# Altium footprint library TranDangKhoa-LIB.PcbLib: 1435 footprints (part 89 of 90)
Each footprint in its own frame and in the unit in brackets; x right, y up, seen from the top. Pads: shape width x height; smd on the part's side, far side on the other; paste and mask are expansions set on the pad; w line width, h text height; cw(c..) or ccw(c..) is an arc to the next point about the centre after c.
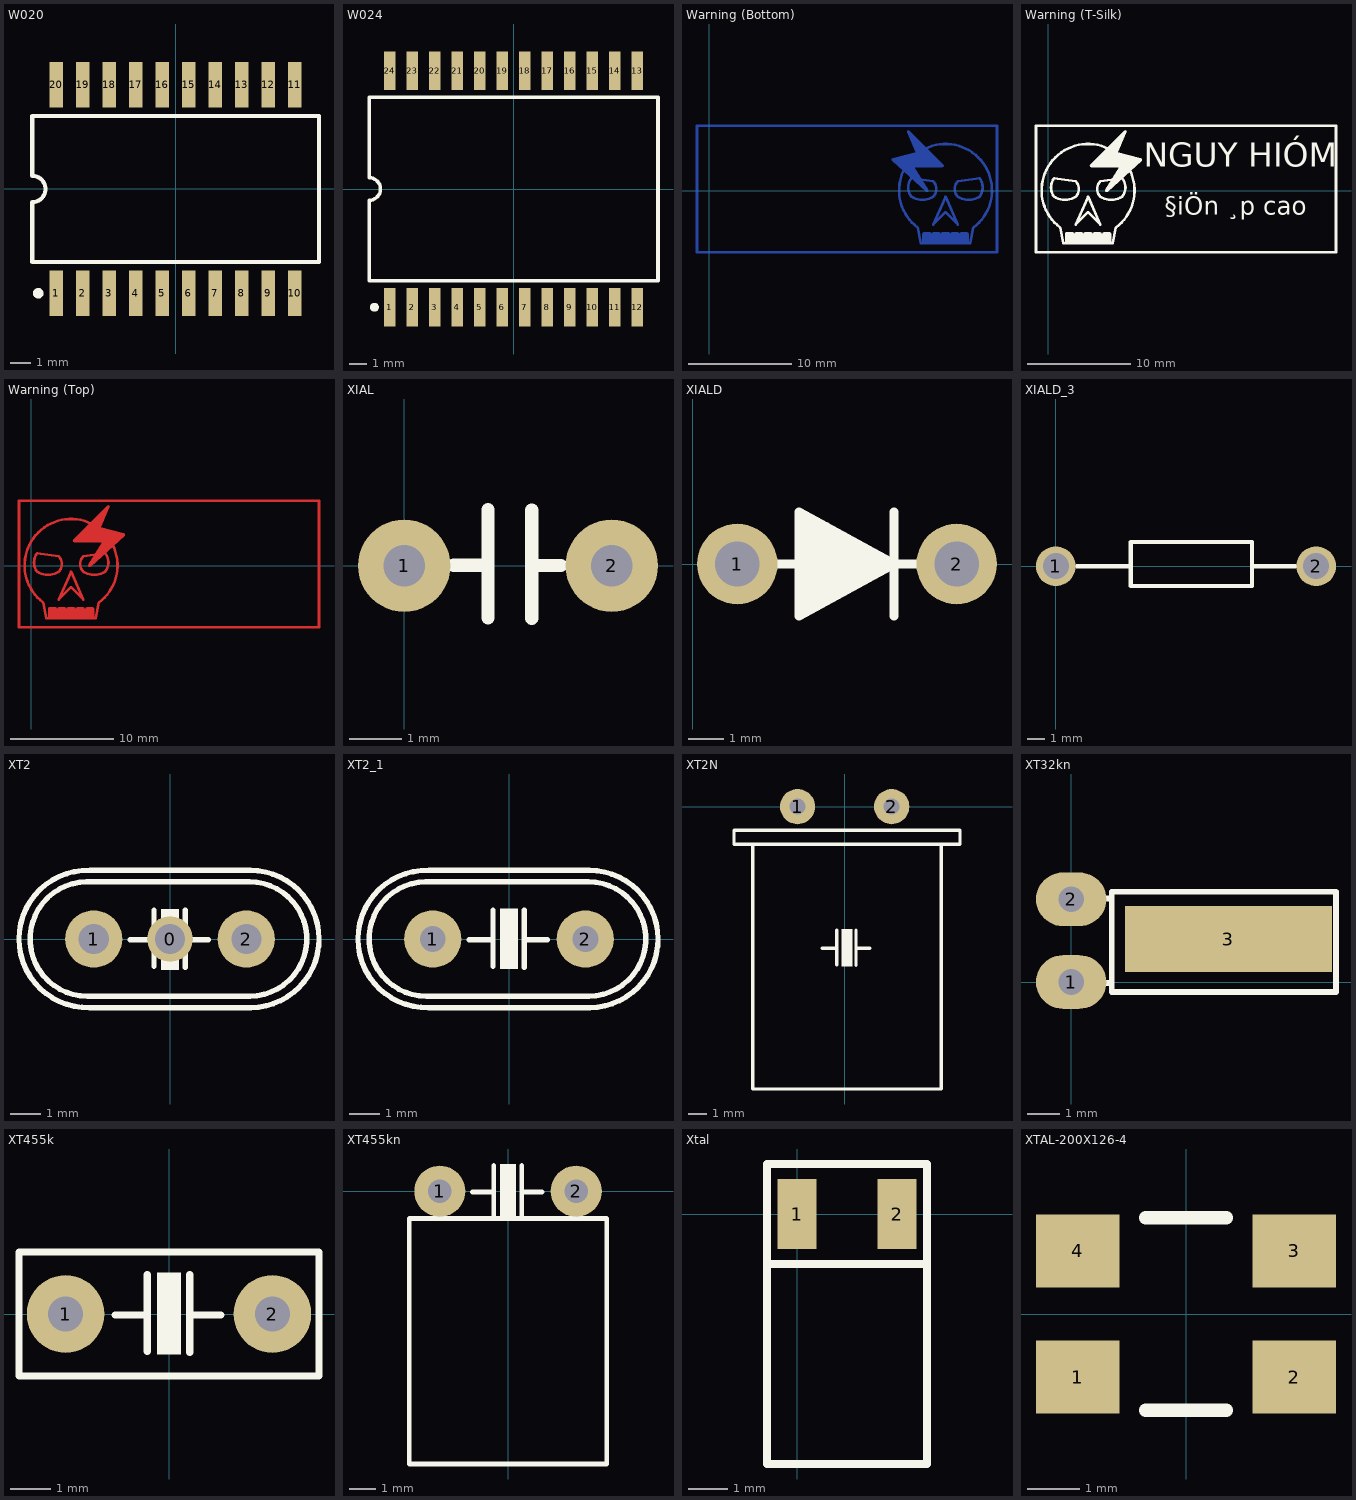
[diagram p88: the footprints below, top view; thin cyan lines are the x and y axes]

## W020 [mm] "DFP; 20 Leads; Body 13.7 x 7.6 mm (LxW max); Pitch 1.27 mm"
height 2.54
pads (20):
  rect 0.65x2.2 smd: 1(-5.715,-5) 2(-4.445,-5) 3(-3.175,-5) 4(-1.905,-5) 5(-0.635,-5) 6(0.635,-5) 7(1.905,-5) 8(3.175,-5) 9(4.445,-5) 10(5.715,-5) 11(5.715,5) 12(4.445,5) 13(3.175,5) 14(1.905,5) 15(0.635,5) 16(-0.635,5) 17(-1.905,5) 18(-3.175,5) 19(-4.445,5) 20(-5.715,5)
Top Overlay:
  circle w0.25: c-6.59,-5 r0.125
  lines w0.2: -6.875,-3.5 6.875,-3.5 6.875,3.5 -6.875,3.5 -6.875,0.635 cw(c-6.875,0) -6.875,-0.635 -6.875,-3.5

## W024 [mm] "DFP; 24 Leads; Body 16.3 x 9.5 mm (LxW max); Pitch 1.27 mm"
height 2.29
pads (24):
  rect 0.65x2.2 smd: 1(-6.985,-6.675) 2(-5.715,-6.675) 3(-4.445,-6.675) 4(-3.175,-6.675) 5(-1.905,-6.675) 6(-0.635,-6.675) 7(0.635,-6.675) 8(1.905,-6.675) 9(3.175,-6.675) 10(4.445,-6.675) 11(5.715,-6.675) 12(6.985,-6.675) 13(6.985,6.675) 14(5.715,6.675) 15(4.445,6.675) 16(3.175,6.675) 17(1.905,6.675) 18(0.635,6.675) 19(-0.635,6.675) 20(-1.905,6.675) 21(-3.175,6.675) 22(-4.445,6.675) 23(-5.715,6.675) 24(-6.985,6.675)
Top Overlay:
  circle w0.25: c-7.86,-6.675 r0.125
  lines w0.2: -8.15,-5.175 -8.15,-0.635 ccw(c-8.15,0) -8.15,0.635 -8.15,5.175 8.15,5.175 8.15,-5.175 -8.15,-5.175

## Warning (Bottom) [mm]
Bottom Layer:
  region: 19.314,5.829 19.285,5.829 19.267,5.81 19.242,5.8 19.232,5.774 19.212,5.754 19.212,5.727 19.202,5.703 19.213,5.677 19.213,5.649 20.05,3.696 17.806,3.135 17.773,3.111 17.737,3.094 17.732,3.081 17.721,3.073 17.715,3.033 17.702,2.995 17.708,2.983 17.705,2.969 17.729,2.936 17.746,2.9 21.048,-0.102 21.081,-0.114 21.11,-0.134 21.129,-0.131 21.147,-0.137 21.179,-0.122 21.213,-0.117 21.225,-0.101 21.242,-0.092 21.254,-0.059 21.274,-0.031 21.271,-0.012 21.278,0.007 21.263,0.038 21.257,0.073 19.888,2.264 22.641,2.264 22.738,2.304 22.779,2.401 22.738,2.498 19.437,5.8 19.411,5.811 19.391,5.83 19.364,5.83 19.34,5.84
  region: 24.345,-4.105 24.305,-4.202 24.305,-5.102 24.345,-5.2 24.442,-5.24 25.042,-5.24 25.139,-5.2 25.18,-5.102 25.18,-4.202 25.139,-4.105 25.042,-4.065 24.442,-4.065
  region: 21.644,-4.105 21.603,-4.202 21.603,-5.102 21.644,-5.2 21.741,-5.24 22.341,-5.24 22.438,-5.2 22.478,-5.102 22.478,-4.202 22.438,-4.105 22.341,-4.065 21.741,-4.065
  region: 20.743,-4.105 20.703,-4.202 20.703,-5.102 20.743,-5.2 20.84,-5.24 21.441,-5.24 21.538,-5.2 21.578,-5.102 21.578,-4.202 21.538,-4.105 21.441,-4.065 20.84,-4.065
  region: 23.444,-4.105 23.404,-4.202 23.404,-5.102 23.444,-5.2 23.542,-5.24 24.142,-5.24 24.239,-5.2 24.279,-5.102 24.279,-4.202 24.239,-4.105 24.142,-4.065 23.542,-4.065
  region: 22.544,-4.105 22.504,-4.202 22.504,-5.102 22.544,-5.2 22.641,-5.24 23.241,-5.24 23.338,-5.2 23.378,-5.102 23.378,-4.202 23.338,-4.105 23.241,-4.065 22.641,-4.065
  lines w0.254: -1.201,-6.003 27.94,-6.003 27.94,6.303 -1.201,6.303 -1.201,-6.003 ; 17.839,3.002 20.24,3.602 19.34,5.703 22.641,2.401 19.64,2.401 21.14,0 17.839,3.002 ; 19.64,-0.6 ccw(c20.69,1.05) 21.741,-0.6 ccw(c20.991,0.15) 21.741,0.9 19.64,1.201 ccw(c20.69,0.3) 19.64,-0.6 ; 20.24,-3.602 cw(c22.941,0.014) 25.643,-3.602 25.342,-5.102 20.54,-5.102 20.24,-3.602 ; 21.741,-3.302 22.941,-0.6 24.142,-3.302 22.941,-2.101 21.741,-3.302 ; 24.142,-0.6 cw(c24.892,0.15) 24.142,0.9 26.243,1.201 cw(c25.042,0.3) 26.243,-0.6 cw(c25.193,1.05) 24.142,-0.6
  text "§iÖn ¸p cao" at 14.732,-3.048 h3
  text "NGUY HIÓM" at 17.526,1.143 h4

## Warning (T-Silk) [mm]
Top Overlay:
  region: 7.483,5.829 7.512,5.829 7.53,5.81 7.555,5.8 7.565,5.774 7.585,5.754 7.585,5.727 7.595,5.703 7.584,5.677 7.584,5.649 6.747,3.696 8.991,3.135 9.024,3.111 9.06,3.094 9.065,3.081 9.076,3.073 9.082,3.033 9.095,2.995 9.089,2.983 9.092,2.969 9.068,2.936 9.051,2.9 5.749,-0.102 5.716,-0.114 5.687,-0.134 5.668,-0.131 5.65,-0.137 5.618,-0.122 5.584,-0.117 5.572,-0.101 5.555,-0.092 5.543,-0.059 5.523,-0.031 5.526,-0.012 5.519,0.007 5.534,0.038 5.54,0.073 6.909,2.264 4.156,2.264 4.059,2.304 4.018,2.401 4.059,2.498 7.36,5.8 7.386,5.811 7.406,5.83 7.433,5.83 7.457,5.84
  region: 2.452,-4.105 2.492,-4.202 2.492,-5.102 2.452,-5.2 2.355,-5.24 1.755,-5.24 1.658,-5.2 1.617,-5.102 1.617,-4.202 1.658,-4.105 1.755,-4.065 2.355,-4.065
  region: 5.153,-4.105 5.194,-4.202 5.194,-5.102 5.153,-5.2 5.056,-5.24 4.456,-5.24 4.359,-5.2 4.319,-5.102 4.319,-4.202 4.359,-4.105 4.456,-4.065 5.056,-4.065
  region: 6.054,-4.105 6.094,-4.202 6.094,-5.102 6.054,-5.2 5.957,-5.24 5.356,-5.24 5.259,-5.2 5.219,-5.102 5.219,-4.202 5.259,-4.105 5.356,-4.065 5.957,-4.065
  region: 3.353,-4.105 3.393,-4.202 3.393,-5.102 3.353,-5.2 3.255,-5.24 2.655,-5.24 2.558,-5.2 2.518,-5.102 2.518,-4.202 2.558,-4.105 2.655,-4.065 3.255,-4.065
  region: 4.253,-4.105 4.293,-4.202 4.293,-5.102 4.253,-5.2 4.156,-5.24 3.556,-5.24 3.459,-5.2 3.419,-5.102 3.419,-4.202 3.459,-4.105 3.556,-4.065 4.156,-4.065
  lines w0.254: -1.201,-6.003 27.94,-6.003 27.94,6.303 -1.201,6.303 -1.201,-6.003 ; 0.554,-0.6 cw(c1.755,0.3) 0.554,1.201 2.655,0.9 cw(c1.905,0.15) 2.655,-0.6 cw(c1.604,1.05) 0.554,-0.6 ; 1.154,-3.602 cw(c3.856,0.014) 6.557,-3.602 6.257,-5.102 1.455,-5.102 1.154,-3.602 ; 2.655,-3.302 3.856,-2.101 5.056,-3.302 3.856,-0.6 2.655,-3.302 ; 4.156,2.401 7.157,2.401 5.657,0 8.958,3.002 6.557,3.602 7.457,5.703 4.156,2.401 ; 5.056,-0.6 ccw(c6.107,1.05) 7.157,-0.6 ccw(c6.107,0.3) 7.157,1.201 5.056,0.9 ccw(c5.806,0.15) 5.056,-0.6
  text "§iÖn ¸p cao" at 11.303,-2.921 h3
  text "NGUY HIÓM" at 9.271,1.524 h4

## Warning (Top) [mm]
Top Layer:
  region: 7.483,5.829 7.512,5.829 7.53,5.81 7.555,5.8 7.565,5.774 7.585,5.754 7.585,5.727 7.595,5.703 7.584,5.677 7.584,5.649 6.747,3.696 8.991,3.135 9.024,3.111 9.06,3.094 9.065,3.081 9.076,3.073 9.082,3.033 9.095,2.995 9.089,2.983 9.092,2.969 9.068,2.936 9.051,2.9 5.749,-0.102 5.716,-0.114 5.687,-0.134 5.668,-0.131 5.65,-0.137 5.618,-0.122 5.584,-0.117 5.572,-0.101 5.555,-0.092 5.543,-0.059 5.523,-0.031 5.526,-0.012 5.519,0.007 5.534,0.038 5.54,0.073 6.909,2.264 4.156,2.264 4.059,2.304 4.018,2.401 4.059,2.498 7.36,5.8 7.386,5.811 7.406,5.83 7.433,5.83 7.457,5.84
  region: 2.452,-4.105 2.492,-4.202 2.492,-5.102 2.452,-5.2 2.355,-5.24 1.755,-5.24 1.658,-5.2 1.617,-5.102 1.617,-4.202 1.658,-4.105 1.755,-4.065 2.355,-4.065
  region: 5.153,-4.105 5.194,-4.202 5.194,-5.102 5.153,-5.2 5.056,-5.24 4.456,-5.24 4.359,-5.2 4.319,-5.102 4.319,-4.202 4.359,-4.105 4.456,-4.065 5.056,-4.065
  region: 6.054,-4.105 6.094,-4.202 6.094,-5.102 6.054,-5.2 5.957,-5.24 5.356,-5.24 5.259,-5.2 5.219,-5.102 5.219,-4.202 5.259,-4.105 5.356,-4.065 5.957,-4.065
  region: 3.353,-4.105 3.393,-4.202 3.393,-5.102 3.353,-5.2 3.255,-5.24 2.655,-5.24 2.558,-5.2 2.518,-5.102 2.518,-4.202 2.558,-4.105 2.655,-4.065 3.255,-4.065
  region: 4.253,-4.105 4.293,-4.202 4.293,-5.102 4.253,-5.2 4.156,-5.24 3.556,-5.24 3.459,-5.2 3.419,-5.102 3.419,-4.202 3.459,-4.105 3.556,-4.065 4.156,-4.065
  lines w0.254: -1.201,-6.003 27.94,-6.003 27.94,6.303 -1.201,6.303 -1.201,-6.003 ; 0.554,-0.6 cw(c1.755,0.3) 0.554,1.201 2.655,0.9 cw(c1.905,0.15) 2.655,-0.6 cw(c1.604,1.05) 0.554,-0.6 ; 1.154,-3.602 cw(c3.856,0.014) 6.557,-3.602 6.257,-5.102 1.455,-5.102 1.154,-3.602 ; 2.655,-3.302 3.856,-2.101 5.056,-3.302 3.856,-0.6 2.655,-3.302 ; 4.156,2.401 7.157,2.401 5.657,0 8.958,3.002 6.557,3.602 7.457,5.703 4.156,2.401 ; 5.056,-0.6 ccw(c6.107,1.05) 7.157,-0.6 ccw(c6.107,0.3) 7.157,1.201 5.056,0.9 ccw(c5.806,0.15) 5.056,-0.6
  text "§iÖn ¸p cao" at 11.303,-2.921 h3
  text "NGUY HIÓM" at 9.271,1.524 h4

## XIAL [mil]
pads (2):
  round 70 hole 31.5 unplated: 1(0,0) 2(157.48,0)
Top Overlay:
  lines w10: 37.4,0.4 53.6,0.4 63.6,0.4 ; 63.6,-39.6 63.6,0.4 ; 63.6,42.4 63.6,0.4 ; 96.8,-39.8 96.8,42.2 ; 96.8,0.2 104.8,0.2 119,0.2

## XIALD [mil]
pads (2):
  round 90 hole 50 unplated: 1(50,0) 2(295,0)
Top Overlay:
  lines w10: 65,0 119,0 ; 127,-48 127,50 ; 127,46 135,46 135,-42 143,-42 143,42 149,42 149,-32 157,-32 157,34 163,34 163,-28 171,-28 171,24 179,24 179,-20 185,-20 185,18 191,18 191,-14 197,-14 197,12 201,12 201,-8 207,-8 ; 220,0 265,0 ; 225,-58 225,0 ; 225,58 225,0 ; 119,0 119,58 225,0 ; 119,0 119,-58 225,0 ; 207,-8 207,8 211,8 211,-8 207,-8

## XIALD_3 [mil]
pads (2):
  round 90 hole 59.05 unplated: 1(0,0) 2(590.55,0)
Top Overlay:
  lines w10: 47.95,0 166.06,0 ; 447.59,0 542.76,0 ; 170,-45 170,55 445,55 445,-45 170,-45

## XT2 [mm] "Footpin for Crystal 2 pin"
pads (3):
  round 1.524 hole 1: 0(0,0)
  round 1.905 hole 1: 1(-2.54,0) 2(2.54,0)
Top Overlay:
  region: 0.292,0.991 0.292,-1.016 -0.292,-1.016 -0.292,0.991
  lines w0.178: -2.769,1.905 ccw(c-2.756,0) -2.75,-1.905 ; -2.717,-1.905 2.617,-1.905 ; -2.692,1.905 2.642,1.905 ; -2.668,-2.286 2.69,-2.286 ccw(c2.675,0) 2.668,2.286 -2.666,2.286 ccw(c-2.743,0.001) -2.668,-2.283 ; -1.321,-0.025 -0.533,-0.025 ; -0.533,-0.914 -0.533,0.965 ; 0.508,-0.94 0.508,0.965 ; 0.508,-0.025 1.27,-0.025 ; 2.642,1.905 cw(c2.647,0) 2.66,-1.905
3D body "SW3dPS-HP49US.STEP": height 3.5, standoff -4, extent -5.929,-2.364 5.421,2.286

## XT2_1 [mil] "Footpin for Crystal 2 pin"
pads (2):
  round 75 hole 34: 1(-100,0) 2(100,0)
Top Overlay:
  region: 11.5,40 11.5,-39 -11.5,-39 -11.5,40
  lines w7: -109,75 ccw(c-108.5,0) -108.27,-75 ; -106.97,-75 103.03,-75 ; -105.97,75 104.03,75 ; -105.02,-90 105.91,-90 ccw(c105.31,0) 105.03,90 -104.97,90.01 ccw(c-108,0.06) -105.02,-89.89 ; -52,-1 -21,-1 ; -21,-36 -21,38 ; 20,-37 20,38 ; 20,-1 50,-1 ; 104,75 cw(c104.23,0) 104.73,-75
3D body "SW3dPS-HP49US.STEP": height 137.8, standoff -157.48, extent -233.43,-93.07 213.43,90

## XT2N [mil] "Crystal 2pin, high 200 mil"
height 200
pads (2):
  round 75 hole 34: 1(-100,0) 2(100,0)
Top Overlay:
  region: 16.5,-260 16.5,-339 -6.5,-339 -6.5,-260
  lines w7: -48,-301 -17,-301 ; -17,-336 -17,-262 ; 24,-337 24,-262 ; 24,-301 54,-301 ; -235,-80 -195,-80 ; -235,-80 -235,-50 ; -235,-80 -195,-80 ; -235,-80 -235,-50 ; -235,-50 245,-50 ; -235,-50 245,-50 ; -195,-600 -195,-80 ; -195,-600 205,-600 ; -195,-600 -195,-80 ; -195,-600 205,-600 ; -195,-80 205,-80 ; -195,-80 205,-80 ; 205,-600 205,-80 ; 205,-600 205,-80 ; 205,-80 245,-80 ; 205,-80 245,-80 ; 245,-80 245,-50 ; 245,-80 245,-50
3D body "SW3dPS-HC49U.STEP": height 91.44, standoff -92.52, extent -209.86,-594.33 230,14.33

## XT32kn [mil] "Crystal for 32,768kHz, 2pin"
height 150
pads (3):
  oval 85x65 hole 31: 1(0,0) 2(0,100)
  rect 250x80 smd: 3(190,52)
Top Overlay:
  lines w7: 34,-1 49,-1 ; 35,101 49,101 ; 49,101 49,-12 320,-12 320,109 49,109 49,101

## XT455k [mil] "Thach anh 455khz (Infrared)"
pads (2):
  round 75 hole 34: 1(-100,0) 2(100,0)
Top Overlay:
  region: 11.5,40 11.5,-39 -11.5,-39 -11.5,40
  lines w7: -52,-1 -21,-1 ; -21,-36 -21,38 ; 20,-37 20,38 ; 20,-1 50,-1 ; -145,-60 -145,60 145,60 145,-60 -145,-60

## XT455kn [mil] "Thach anh 455khz (Infrared)"
pads (2):
  round 75 hole 34: 1(-100,0) 2(100,0)
Top Overlay:
  region: 11.5,40 11.5,-39 -11.5,-39 -11.5,40
  lines w7: -52,-1 -21,-1 ; -21,-36 -21,38 ; 20,-37 20,38 ; 20,-1 50,-1 ; -145,-400 -145,-40 145,-40 145,-400 -145,-400

## Xtal [mm] "thach anh dan loai nho"
height 0.6
pads (2):
  rect 1x1.778 smd: 1(0,0) 2(2.54,0)
Top Overlay:
  lines w0.2: -0.762,-1.27 3.302,-1.27 ; -0.762,-6.35 -0.762,-5.588 -0.762,1.27 3.302,1.27 3.302,-6.35 -0.762,-6.35

## XTAL-200X126-4 [mil]
pads (4):
  rect 63x55 smd: 1(-81.5,-47.5) 2(81.5,-47.5) 3(81.5,47.5) 4(-81.5,47.5)
Top Overlay:
  lines w10: -30.5,-72.5 30.5,-72.5 ; -30.5,72.5 30.5,72.5
3D body: height 39.37, standoff 0, extent -114.46,-46.87 113.11,46.73
3D body: height 19.68, standoff 0, extent -97.83,24.91 -62.28,51.12
3D body: height 19.68, standoff 0, extent 67.17,24.91 102.72,51.12
3D body: height 19.68, standoff 0, extent -103.01,-51.67 -67.46,-25.46
3D body: height 19.68, standoff 0, extent 62.19,-52.22 97.74,-26.01